# Altium footprint library ICs And Semiconductors THD.PcbLib: 292 footprints (part 13 of 19)
Each footprint in its own frame and in the unit in brackets; x right, y up, seen from the top. Pads: shape width x height; smd on the part's side, far side on the other; paste and mask are expansions set on the pad; w line width, h text height; cw(c..) or ccw(c..) is an arc to the next point about the centre after c.
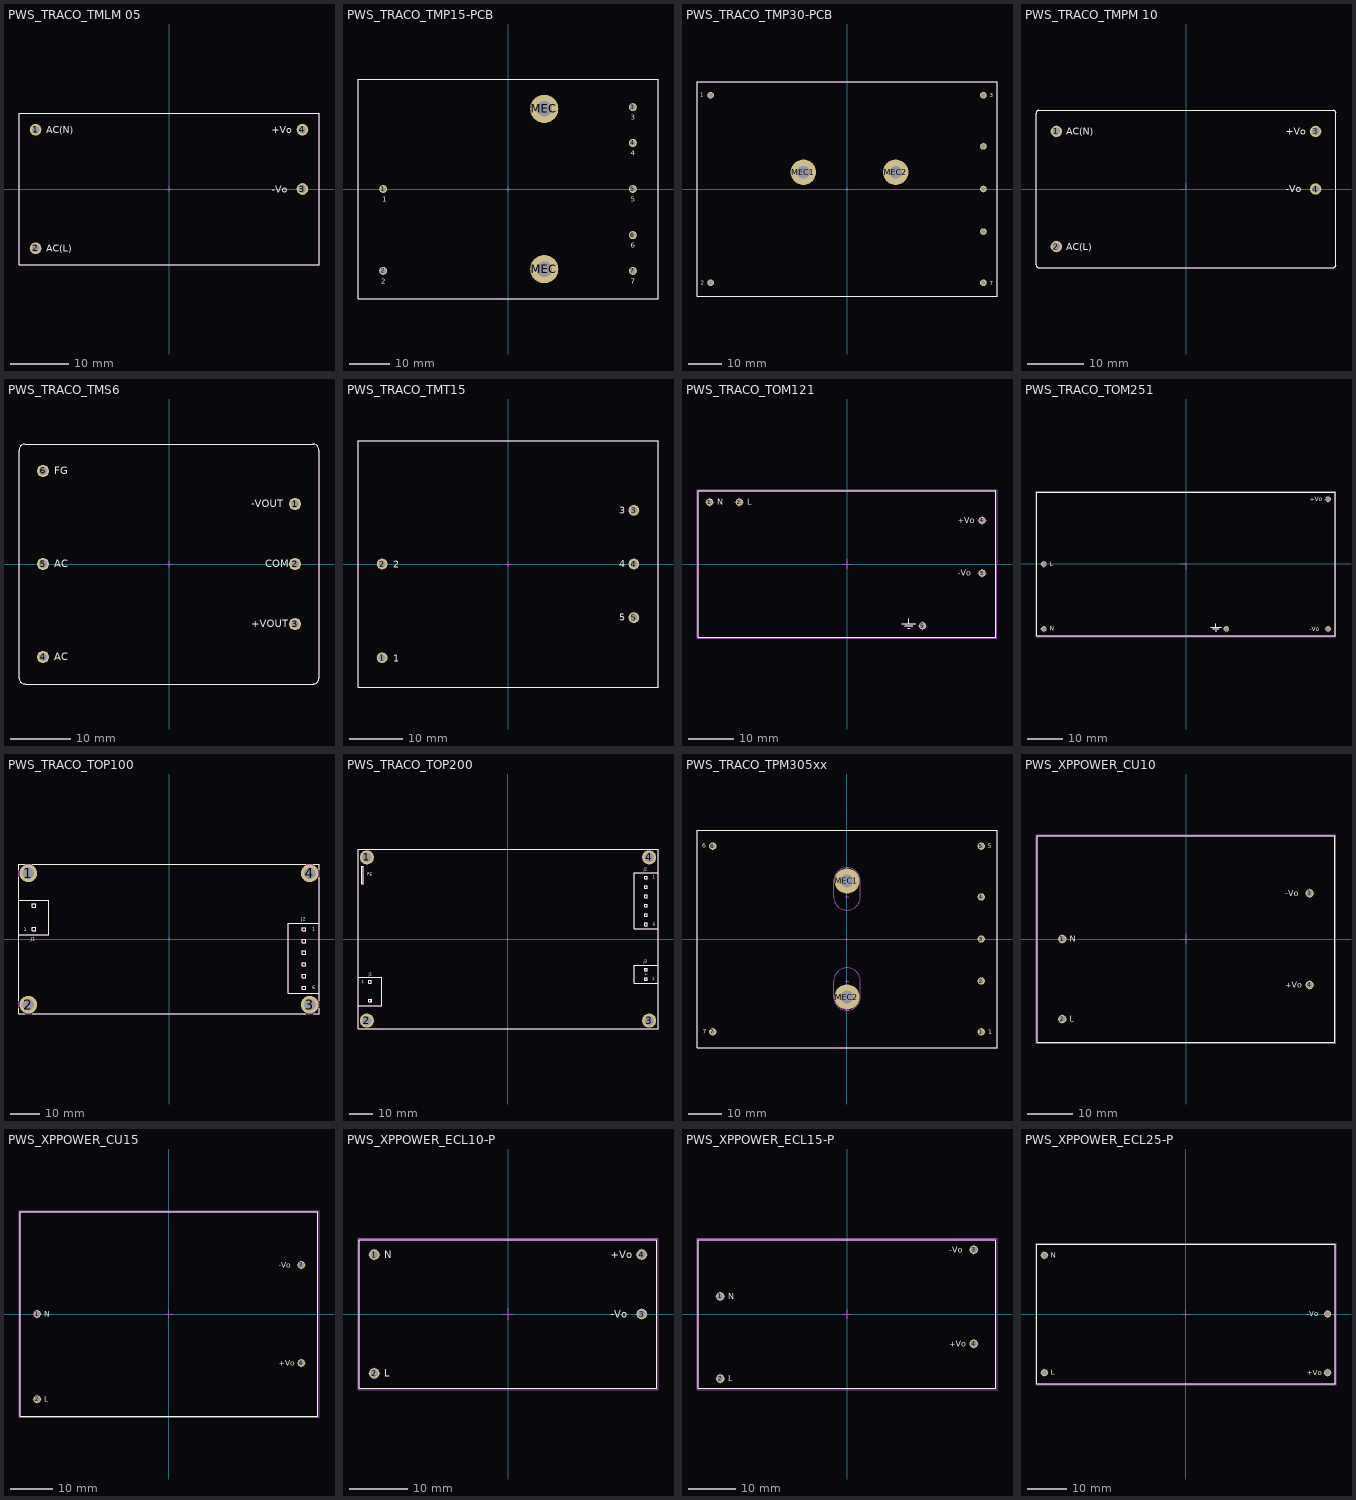
[diagram p12: the footprints below, top view; thin cyan lines are the x and y axes]

## PWS_TRACO_TMLM 05 [mm] "TMLM 05 Series , Body 50.9x25.5mm, Power Supply"
height 15.66
pads (4):
  round 2 hole 1.3: 1(-22.86,10.16) 2(-22.86,-10.16) 3(22.86,0) 4(22.86,10.16)
Top Overlay:
  lines w0.2: -25.7,-13 -25.7,13 25.7,13 25.7,-13 -25.7,-13
  text "AC(L)" at -21.073,-10.793 h1.2
  text "-Vo" at 17.585,-0.61 h1.2
  text "+Vo" at 17.585,9.55 h1.2
  text "AC(N)" at -21.073,9.527 h1.2
Notvisible:
  lines w0.1: -23.36,-10.16 -22.86,-10.16 ; -23.36,10.16 -22.86,10.16 ; -22.86,-10.66 -22.86,-10.16 ; -22.86,-9.66 -22.86,-10.16 ; -22.86,9.66 -22.86,10.16 ; -22.86,10.66 -22.86,10.16 ; -22.36,-10.16 -22.86,-10.16 ; -22.36,10.16 -22.86,10.16 ; -0.5,0 0,0 ; 0,-0.5 0,0 ; 0,0.5 0,0 ; 0.5,0 0,0 ; 22.36,0 22.86,0 ; 22.36,10.16 22.86,10.16 ; 22.86,-0.5 22.86,0 ; 22.86,0.5 22.86,0 ; 22.86,9.66 22.86,10.16 ; 22.86,10.66 22.86,10.16 ; 23.36,0 22.86,0 ; 23.36,10.16 22.86,10.16
Mechanical 14:
  lines w0.1: -25.7,-13 -25.7,13 25.7,13 25.7,-13 -25.7,-13
  text "AC(L)" at -21.073,-10.793 h1.2
  text "AC(N)" at -21.073,9.527 h1.2
  text "+Vo" at 17.585,9.55 h1.2
  text "-Vo" at 17.585,-0.61 h1.2
3D body "PWS_TRACO_TMLM 05.stp": height 15.75, standoff -3.8, extent -25.7,-13 25.7,13

## PWS_TRACO_TMP15-PCB [mm] "TMP15 Model For PCB Mount, Body 74x54mm"
height 19.8
pads (9):
  round 2 hole 1.3: 1(-31,0) 2(-31,-20.32) 3(31,20.32) 4(31,11.43) 5(31,0) 6(31,-11.43) 7(31,-20.32)
  round 7 hole 3.8: MEC(9,-19.9) MEC(9,19.9)
Top Overlay:
  lines w0.2: -37.25,-27.25 37.25,-27.25 37.25,27.25 -37.25,27.25 -37.25,-27.25
  text "3" at 30.53,17.16 h1.27
  text "1" at -31.27,-3.16 h1.27
  text "2" at -31.47,-23.48 h1.27
  text "6" at 30.53,-14.59 h1.27
  text "7" at 30.53,-23.48 h1.27
  text "5" at 30.53,-3.16 h1.27
  text "4" at 30.53,8.27 h1.27
Notvisible:
  lines w0.1: -31.5,-20.32 -31,-20.32 ; -31.5,0 -31,0 ; -31,-20.82 -31,-20.32 ; -31,-19.82 -31,-20.32 ; -31,-0.5 -31,0 ; -31,0.5 -31,0 ; -30.5,-20.32 -31,-20.32 ; -30.5,0 -31,0 ; -0.5,0 0,0 ; 0,-0.5 0,0 ; 0,0.5 0,0 ; 0.5,0 0,0 ; 8.5,-19.9 9,-19.9 ; 8.5,19.9 9,19.9 ; 9,-20.4 9,-19.9 ; 9,-19.4 9,-19.9 ; 9,19.4 9,19.9 ; 9,20.4 9,19.9 ; 9.5,-19.9 9,-19.9 ; 9.5,19.9 9,19.9 ; 30.5,-20.32 31,-20.32 ; 30.5,-11.43 31,-11.43 ; 30.5,0 31,0 ; 30.5,11.43 31,11.43 ; 30.5,20.32 31,20.32 ; 31,-20.82 31,-20.32 ; 31,-19.82 31,-20.32 ; 31,-11.93 31,-11.43 ; 31,-10.93 31,-11.43 ; 31,-0.5 31,0 ; 31,0.5 31,0 ; 31,10.93 31,11.43 ; 31,11.93 31,11.43 ; 31,19.82 31,20.32 ; 31,20.82 31,20.32 ; 31.5,-20.32 31,-20.32 ; 31.5,-11.43 31,-11.43 ; 31.5,0 31,0 ; 31.5,11.43 31,11.43 ; 31.5,20.32 31,20.32
Mechanical 14:
  lines w0.1: -37.25,-27.25 37.25,-27.25 37.25,27.25 -37.25,27.25 -37.25,-27.25
  text "3" at 30.53,17.16 h1.27
  text "1" at -31.27,-3.16 h1.27
  text "2" at -31.47,-23.48 h1.27
  text "6" at 30.53,-14.59 h1.27
  text "7" at 30.53,-23.48 h1.27
  text "5" at 30.53,-3.16 h1.27
  text "4" at 30.53,8.27 h1.27
3D body "PWS_TRACO_TMP15-PCB.stp": height 19.85, standoff -4.3, extent -37.25,-27.25 37.25,27.25

## PWS_TRACO_TMP30-PCB [mm] "TPM  30W Model For PCB Mount, Body 88.9x63.5mm"
height 22
pads (9):
  round 2 hole 1.3: 1(-40.65,27.94) 2(-40.65,-27.94) 3(40.65,27.94) 4(40.65,12.7) 5(40.65,0) 6(40.65,-12.7) 7(40.65,-27.94)
  round 7.6 hole 3.8: MEC1(-13,5) MEC2(14.5,5)
Top Overlay:
  lines w0.2: -44.7,-32 -44.7,32 44.7,32 44.7,-32 -44.7,-32
  text "7" at 42.58,-28.71 h1.2
  text "1" at -43.72,27.46 h1.2
  text "2" at -43.52,-28.605 h1.2
  text "3" at 42.48,27.365 h1.2
Notvisible:
  lines w0.1: -41.15,-27.94 -40.65,-27.94 ; -41.15,27.94 -40.65,27.94 ; -40.65,-28.44 -40.65,-27.94 ; -40.65,-27.44 -40.65,-27.94 ; -40.65,27.44 -40.65,27.94 ; -40.65,28.44 -40.65,27.94 ; -40.15,-27.94 -40.65,-27.94 ; -40.15,27.94 -40.65,27.94 ; -13.5,5 -13,5 ; -13,4.5 -13,5 ; -13,5.5 -13,5 ; -12.5,5 -13,5 ; -0.5,0 0,0 ; 0,-0.5 0,0 ; 0,0.5 0,0 ; 0.5,0 0,0 ; 14,5 14.5,5 ; 14.5,4.5 14.5,5 ; 14.5,5.5 14.5,5 ; 15,5 14.5,5 ; 40.15,-27.94 40.65,-27.94 ; 40.15,-12.7 40.65,-12.7 ; 40.15,0 40.65,0 ; 40.15,12.7 40.65,12.7 ; 40.15,27.94 40.65,27.94 ; 40.65,-28.44 40.65,-27.94 ; 40.65,-27.44 40.65,-27.94 ; 40.65,-13.2 40.65,-12.7 ; 40.65,-12.2 40.65,-12.7 ; 40.65,-0.5 40.65,0 ; 40.65,0.5 40.65,0 ; 40.65,12.2 40.65,12.7 ; 40.65,13.2 40.65,12.7 ; 40.65,27.44 40.65,27.94 ; 40.65,28.44 40.65,27.94 ; 41.15,-27.94 40.65,-27.94 ; 41.15,-12.7 40.65,-12.7 ; 41.15,0 40.65,0 ; 41.15,12.7 40.65,12.7 ; 41.15,27.94 40.65,27.94
Mechanical 14:
  lines w0.1: -44.7,-32 -44.7,32 44.7,32 44.7,-32 -44.7,-32
  text "7" at 42.58,-28.71 h1.2
  text "1" at -43.72,27.46 h1.2
  text "2" at -43.52,-28.605 h1.2
  text "3" at 42.48,27.365 h1.2
3D body "PWS_TRACO_TMP30-PCB.stp": height 22, standoff -3.6, extent -44.7,-32 44.7,32

## PWS_TRACO_TMPM 10 [mm] "TMPM 10 Series, Body 52.4x27.2mm, Power Supply"
height 24
pads (4):
  round 2 hole 1.3: 1(-22.86,10.16) 2(-22.86,-10.16) 3(22.86,10.16) 4(22.86,0)
Top Overlay:
  lines w0.2: -26.45,-13.35 ccw(c-25.95,-13.35) -25.95,-13.85 25.95,-13.85 ccw(c25.95,-13.35) 26.45,-13.35 26.45,13.35 ccw(c25.95,13.35) 25.95,13.85 -25.95,13.85 ccw(c-25.95,13.35) -26.45,13.35 -26.45,-13.35
  text "AC(N)" at -21.073,9.527 h1.2
  text "+Vo" at 17.585,9.55 h1.2
  text "-Vo" at 17.585,-0.61 h1.2
  text "AC(L)" at -21.073,-10.793 h1.2
Notvisible:
  lines w0.2: -23.86,-10.16 -22.86,-10.16 -22.86,-9.16 ; -23.86,10.16 -22.86,10.16 -22.86,11.16 ; -1,0 0,0 0,1 ; 21.86,0 22.86,0 22.86,1 ; 21.86,10.16 22.86,10.16 22.86,11.16
  text "3" at 24.765,9.525 h1.2
  text "4" at 24.765,-0.635 h1.2
  text "2" at -25.4,-10.795 h1.2
  text "1" at -25.4,9.527 h1.2
Mechanical 14:
  lines w0.1: -26.45,-13.35 ccw(c-25.95,-13.35) -25.95,-13.85 25.95,-13.85 ccw(c25.95,-13.35) 26.45,-13.35 26.45,13.35 ccw(c25.95,13.35) 25.95,13.85 -25.95,13.85 ccw(c-25.95,13.35) -26.45,13.35 -26.45,-13.35
  text "-Vo" at 17.585,-0.61 h1.2
  text "+Vo" at 17.585,9.55 h1.2
  text "AC(N)" at -21.073,9.527 h1.2
  text "AC(L)" at -21.073,-10.793 h1.2
3D body "PWS_TRACO_TMPM 10.stp": height 24, standoff -3.1, extent -26.45,-13.85 26.45,13.85

## PWS_TRACO_TMS6 [mm] "TMS 6 Series , Body 50x40mm, Height 20mm"
height 20
pads (6):
  round 2 hole 1.3: 1(21,10) 2(21,0) 3(21,-10) 4(-21,-15.5) 5(-21,0) 6(-21,15.5)
Top Overlay:
  lines w0.2: -25,-19 ccw(c-24,-19) -24,-20 24,-20 ccw(c24,-19) 25,-19 25,19 ccw(c24,19) 24,20 -24,20 ccw(c-24,19) -25,19 -25,-19
  text "-VOUT" at 13.719,9.495 h1.2
  text "COM" at 16.025,-0.55 h1.2
  text "+VOUT" at 13.719,-10.505 h1.2
  text "FG" at -19.125,14.95 h1.2
  text "AC" at -19.125,-0.55 h1.2
  text "AC" at -19.125,-16.05 h1.2
Notvisible:
  lines w0.1: -21.5,-15.5 -21,-15.5 ; -21.5,0 -21,0 ; -21.5,15.5 -21,15.5 ; -21,-16 -21,-15.5 ; -21,-15 -21,-15.5 ; -21,-0.5 -21,0 ; -21,0.5 -21,0 ; -21,15 -21,15.5 ; -21,16 -21,15.5 ; -20.5,-15.5 -21,-15.5 ; -20.5,0 -21,0 ; -20.5,15.5 -21,15.5 ; -0.5,0 0,0 ; 0,-0.5 0,0 ; 0,0.5 0,0 ; 0.5,0 0,0 ; 20.5,-10 21,-10 ; 20.5,0 21,0 ; 20.5,10 21,10 ; 21,-10.5 21,-10 ; 21,-9.5 21,-10 ; 21,-0.5 21,0 ; 21,0.5 21,0 ; 21,9.5 21,10 ; 21,10.5 21,10 ; 21.5,-10 21,-10 ; 21.5,0 21,0 ; 21.5,10 21,10
Mechanical 14:
  lines w0.1: -25,-19 ccw(c-24,-19) -24,-20 24,-20 ccw(c24,-19) 25,-19 25,19 ccw(c24,19) 24,20 -24,20 ccw(c-24,19) -25,19 -25,-19
  text "AC" at -19.125,-16.05 h1.2
  text "AC" at -19.125,-0.55 h1.2
  text "FG" at -19.125,14.95 h1.2
  text "+VOUT" at 13.719,-10.505 h1.2
  text "COM" at 16.025,-0.55 h1.2
  text "-VOUT" at 13.719,9.495 h1.2
3D body "PWS_TRACO_TMS6.stp": height 20.1, standoff -3.6, extent -25,-20 25,20

## PWS_TRACO_TMT15 [mm] "TMT  15W Model For PCB Mount, Body 55x45mm"
height 25
pads (5):
  round 2 hole 1.3: 1(-23.5,-17.5) 2(-23.5,0) 3(23.5,10) 4(23.5,0) 5(23.5,-10)
Top Overlay:
  lines w0.2: -28,-23 28,-23 28,23 -28,23 -28,-23
  text "3" at 20.72,9.41 h1.27
  text "4" at 20.72,-0.59 h1.27
  text "5" at 20.72,-10.59 h1.27
  text "2" at -21.42,-0.71 h1.27
  text "1" at -21.42,-18.21 h1.27
Notvisible:
  lines w0.1: -24,-17.5 -23.5,-17.5 ; -24,0 -23.5,0 ; -23.5,-18 -23.5,-17.5 ; -23.5,-17 -23.5,-17.5 ; -23.5,-0.5 -23.5,0 ; -23.5,0.5 -23.5,0 ; -23,-17.5 -23.5,-17.5 ; -23,0 -23.5,0 ; -0.5,0 0,0 ; 0,-0.5 0,0 ; 0,0.5 0,0 ; 0.5,0 0,0 ; 23,-10 23.5,-10 ; 23,0 23.5,0 ; 23,10 23.5,10 ; 23.5,-10.5 23.5,-10 ; 23.5,-9.5 23.5,-10 ; 23.5,-0.5 23.5,0 ; 23.5,0.5 23.5,0 ; 23.5,9.5 23.5,10 ; 23.5,10.5 23.5,10 ; 24,-10 23.5,-10 ; 24,0 23.5,0 ; 24,10 23.5,10
Mechanical 14:
  lines w0.1: -28,-23 -28,23 28,23 28,-23 -28,-23
  text "3" at 20.72,9.41 h1.27
  text "4" at 20.72,-0.59 h1.27
  text "5" at 20.72,-10.59 h1.27
  text "2" at -21.42,-0.71 h1.27
  text "1" at -21.42,-18.21 h1.27
3D body "PWS_TRACO_TMT15.stp": height 25, standoff -3.8, extent -28,-23 28,23

## PWS_TRACO_TOM121 [mm] "TOM12W Single Output Series , Body 65x32mm, Power Supply"
height 23
pads (5):
  round 1.6 hole 1.1: 1(-30,13.5) 2(-23.5,13.5) 3(29.5,-2) 4(29.5,9.5) 5(16.5,-13.5)
Top Overlay:
  lines w0.2: 12,-13 15,-13 ; 12.6,-13.5 14.4,-13.5 ; 13.3,-14 13.7,-14 ; 13.5,-13 13.5,-12 ; -32.5,-16 -32.5,16 32.5,16 32.5,-16 -32.5,-16
  text "-Vo" at 24.225,-2.61 h1.27
  text "+Vo" at 24.225,8.89 h1.27
  text "L" at -21.825,12.91 h1.27
  text "N" at -28.325,12.91 h1.27
Notvisible:
  lines w0.1: -31,13.5 -30,13.5 ; -30,12.5 -30,13.5 ; -30,14.5 -30,13.5 ; -29,13.5 -30,13.5 ; -24.5,13.5 -23.5,13.5 ; -23.5,12.5 -23.5,13.5 ; -23.5,14.5 -23.5,13.5 ; -22.5,13.5 -23.5,13.5 ; -1,0 0,0 ; 0,-1 0,0 ; 0,1 0,0 ; 1,0 0,0 ; 15.5,-13.5 16.5,-13.5 ; 16.5,-14.5 16.5,-13.5 ; 16.5,-12.5 16.5,-13.5 ; 17.5,-13.5 16.5,-13.5 ; 28.5,-2 29.5,-2 ; 28.5,9.5 29.5,9.5 ; 29.5,-3 29.5,-2 ; 29.5,-1 29.5,-2 ; 29.5,8.5 29.5,9.5 ; 29.5,10.5 29.5,9.5 ; 30.5,-2 29.5,-2 ; 30.5,9.5 29.5,9.5
Mechanical 14:
  lines w0.1: 12,-13 15,-13 ; 12.6,-13.5 14.4,-13.5 ; 13.3,-14 13.7,-14 ; 13.5,-13 13.5,-12 ; -32.5,-16 -32.5,16 32.5,16 32.5,-16 -32.5,-16
  text "-Vo" at 24.225,-2.61 h1.27
  text "+Vo" at 24.225,8.89 h1.27
  text "L" at -21.825,12.91 h1.27
  text "N" at -28.325,12.91 h1.27
Mechanical 15:
  lines w0.05: -32.75,-16.25 -32.75,16.25 32.75,16.25 32.75,-16.25 -32.75,-16.25
3D body: height 23, standoff 4.4, extent -32.5,-16 32.5,16
3D body: height 4.4, standoff -3, extent -23.9,13.101 -23.101,13.899
3D body: height 4.4, standoff -3, extent -30.4,13.101 -29.601,13.899
3D body: height 4.4, standoff -3, extent 16.101,-13.899 16.899,-13.101
3D body: height 4.4, standoff -3, extent 29.101,-2.399 29.9,-1.601
3D body: height 4.4, standoff -3, extent 29.101,9.101 29.9,9.899

## PWS_TRACO_TOM251 [mm] "TOM25W Single Output Series , Body 85x41mm, Power Supply"
height 29.5
pads (5):
  round 1.6 hole 1.1: 1(-40.5,-18.5) 2(-40.5,0) 3(40.5,-18.5) 4(40.5,18.5) 5(11.5,-18.5)
Top Overlay:
  lines w0.2: 7,-18 10,-18 ; 7.6,-18.5 9.4,-18.5 ; 8.3,-19 8.7,-19 ; 8.5,-18 8.5,-17 ; -42.5,-20.5 -42.5,20.5 42.5,20.5 42.5,-20.5 -42.5,-20.5
  text "-Vo" at 35.225,-19.11 h1.27
  text "+Vo" at 35.225,17.89 h1.27
  text "L" at -38.825,-0.59 h1.27
  text "N" at -38.825,-19.09 h1.27
Notvisible:
  lines w0.1: -41.5,-18.5 -40.5,-18.5 -40.5,-19.5 ; -41.5,0 -40.5,0 -40.5,-1 ; -1.5,0 0,0 0,-1.5 ; 10.5,-18.5 11.5,-18.5 11.5,-19.5 ; 39.5,-18.5 40.5,-18.5 40.5,-19.5 ; 39.5,18.5 40.5,18.5 40.5,17.5
Mechanical 14:
  lines w0.1: 7,-18 10,-18 ; 7.6,-18.5 9.4,-18.5 ; 8.3,-19 8.7,-19 ; 8.5,-18 8.5,-17 ; -42.5,-20.5 42.5,-20.5 42.5,20.5 -42.5,20.5 -42.5,-20.5
  text "N" at -38.825,-19.09 h1.27
  text "L" at -38.825,-0.59 h1.27
  text "+Vo" at 35.225,17.89 h1.27
  text "-Vo" at 35.225,-19.11 h1.27
Mechanical 15:
  lines w0.05: -42.75,-20.75 -42.75,20.75 42.75,20.75 42.75,-20.75 -42.75,-20.75
3D body: height 4.4, standoff -3, extent 40.101,18.101 40.899,18.899
3D body: height 4.4, standoff -3, extent 40.101,-18.899 40.899,-18.101
3D body: height 4.4, standoff -3, extent 11.101,-18.899 11.899,-18.101
3D body: height 4.4, standoff -3, extent -40.899,-18.899 -40.101,-18.101
3D body: height 4.4, standoff -3, extent -40.899,-0.399 -40.101,0.399
3D body: height 29.5, standoff 4.4, extent -42.5,-20.5 42.5,20.5

## PWS_TRACO_TOP100 [mm] "TOP 100 Serie 100W Power Supplies, Body 101.6 x 50.8mm"
height 33.2
pads (4):
  round 6 hole 4: 1(-47.65,22.25) 2(-47.65,-22.25) 3(47.65,-22.25) 4(47.65,22.25)
Top Overlay:
  lines w0.2: -50.8,-23.53 -50.8,-25.4 -48.93,-25.4 ; -50.8,-20.97 -50.8,20.97 ; -50.8,1.465 -40.792,1.465 -40.792,13.2 -50.8,13.2 ; -50.8,23.53 -50.8,25.4 -48.93,25.4 ; -46.37,-25.4 46.37,-25.4 ; -46.37,25.4 46.37,25.4 ; 48.93,-25.4 50.8,-25.4 50.8,-23.53 ; 48.93,25.4 50.8,25.4 50.8,23.53 ; 50.8,-20.97 50.8,20.97 ; 50.8,-3.16 50.8,-18.4 40.4,-18.4 40.4,5.34 50.8,5.34 ; -46.266,2.799 -45.123,2.799 -45.123,3.942 -46.266,3.942 -46.266,2.799 ; -46.266,10.724 -45.123,10.724 -45.123,11.867 -46.266,11.867 -46.266,10.724 ; 45.123,-17.067 46.266,-17.067 46.266,-15.924 45.123,-15.924 45.123,-17.067 ; 45.123,-13.104 46.266,-13.104 46.266,-11.961 45.123,-11.961 45.123,-13.104 ; 45.123,-9.142 46.266,-9.142 46.266,-7.999 45.123,-7.999 45.123,-9.142 ; 45.123,-5.179 46.266,-5.179 46.266,-4.036 45.123,-4.036 45.123,-5.179 ; 45.123,-1.217 46.266,-1.217 46.266,-0.074 45.123,-0.074 45.123,-1.217 ; 45.123,2.746 46.266,2.746 46.266,3.889 45.123,3.889 45.123,2.746
  text "J1" at -46.825,-0.51 h1.2
  text "J2" at 44.775,6.19 h1.2
  text "1" at 48.525,2.79 h1.2
  text "6" at 48.525,-17.022 h1.2
  text "1" at -49.141,2.644 h1.2
Notvisible:
  lines w0.1: -48.15,-22.25 -47.65,-22.25 ; -48.15,22.25 -47.65,22.25 ; -47.65,-22.75 -47.65,-22.25 ; -47.65,-21.75 -47.65,-22.25 ; -47.65,21.75 -47.65,22.25 ; -47.65,22.75 -47.65,22.25 ; -47.15,-22.25 -47.65,-22.25 ; -47.15,22.25 -47.65,22.25 ; -0.5,0 0,0 ; 0,-0.5 0,0 ; 0,0.5 0,0 ; 0.5,0 0,0 ; 47.15,-22.25 47.65,-22.25 ; 47.15,22.25 47.65,22.25 ; 47.65,-22.75 47.65,-22.25 ; 47.65,-21.75 47.65,-22.25 ; 47.65,21.75 47.65,22.25 ; 47.65,22.75 47.65,22.25 ; 48.15,-22.25 47.65,-22.25 ; 48.15,22.25 47.65,22.25
Mechanical 14:
  circle w0.1: c-47.65,-22.25 r2
  circle w0.1: c-47.65,22.25 r2
  circle w0.1: c47.65,22.25 r2
  circle w0.1: c47.65,-22.25 r2
  lines w0.1: -50.8,1.465 -40.792,1.465 -40.792,13.2 -50.8,13.2 ; 50.8,-18.4 40.4,-18.4 40.4,5.34 50.8,5.34 ; -50.8,-25.4 50.8,-25.4 50.8,25.4 -50.8,25.4 -50.8,-25.4 ; -46.266,2.799 -45.123,2.799 -45.123,3.942 -46.266,3.942 -46.266,2.799 ; -46.266,10.724 -45.123,10.724 -45.123,11.867 -46.266,11.867 -46.266,10.724 ; 45.123,-17.067 46.266,-17.067 46.266,-15.924 45.123,-15.924 45.123,-17.067 ; 45.123,-13.104 46.266,-13.104 46.266,-11.961 45.123,-11.961 45.123,-13.104 ; 45.123,-9.142 46.266,-9.142 46.266,-7.999 45.123,-7.999 45.123,-9.142 ; 45.123,-5.179 46.266,-5.179 46.266,-4.036 45.123,-4.036 45.123,-5.179 ; 45.123,-1.217 46.266,-1.217 46.266,-0.074 45.123,-0.074 45.123,-1.217 ; 45.123,2.746 46.266,2.746 46.266,3.889 45.123,3.889 45.123,2.746
  text "J1" at -46.825,-0.51 h1.2
  text "J2" at 44.775,6.19 h1.2
  text "1" at 48.525,2.79 h1.2
  text "6" at 48.525,-17.022 h1.2
  text "1" at -49.141,2.644 h1.2
3D body "PWS_TRACO_TOP100.stp": height 34.8, standoff -5.4, extent -50.8,-25.425 50.8,25.426

## PWS_TRACO_TOP200 [mm] "TOP 200 Serie 200W Power Supplies, Body 127 x 76.2mm"
height 35.4
pads (4):
  round 6 hole 4: 1(-59.75,34.55) 2(-59.75,-34.55) 3(59.75,-34.55) 4(59.75,34.55)
Top Overlay:
  lines w0.2: -63.5,-28.219 -53.492,-28.219 -53.492,-16.205 -63.5,-16.205 ; 56.236,4.293 63.5,4.318 53.492,4.318 53.492,27.975 63.5,27.975 ; 59.436,-18.8 57.214,-18.8 63.5,-18.8 ; 59.436,-11.028 57.214,-11.028 63.5,-11.028 ; 61.576,-18.8 63.5,-18.8 ; 61.576,-11.028 63.5,-11.028 ; -58.966,-26.607 -57.823,-26.607 -57.823,-25.464 -58.966,-25.464 ; -58.966,-26.607 -58.966,-25.464 ; -58.966,-26.607 -58.966,-25.464 ; -58.966,-26.607 -57.747,-26.607 -57.747,-25.464 -58.966,-25.464 ; -58.966,-18.682 -57.823,-18.682 ; -58.966,-18.682 -58.966,-17.539 ; -58.966,-18.682 -58.966,-17.539 ; -58.966,-18.682 -57.823,-18.682 ; -58.966,-17.539 -57.823,-17.539 ; -58.966,-17.539 -57.823,-17.539 ; -57.823,-18.682 -57.823,-17.539 ; -57.823,-18.682 -57.823,-17.539 ; 63.5,-18.8 53.492,-18.8 53.492,-11.028 63.5,-11.028 ; -63.5,-38.1 -63.5,38.1 63.5,38.1 63.5,-38.1 -63.5,-38.1 ; -62,23.307 -61.2,23.307 -61.2,30.8 -62,30.8 -62,23.307 ; 57.823,-17.467 58.966,-17.467 58.966,-16.324 57.823,-16.324 57.823,-17.467 ; 57.823,-13.504 58.966,-13.504 58.966,-12.361 57.823,-12.361 57.823,-13.504 ; 57.823,5.652 58.966,5.652 58.966,6.795 57.823,6.795 57.823,5.652 ; 57.823,9.614 58.966,9.614 58.966,10.757 57.823,10.757 57.823,9.614 ; 57.823,13.576 58.966,13.576 58.966,14.719 57.823,14.719 57.823,13.576 ; 57.823,17.539 58.966,17.539 58.966,18.682 57.823,18.682 57.823,17.539 ; 57.823,21.501 58.966,21.501 58.966,22.644 57.823,22.644 57.823,21.501 ; 57.823,25.464 58.966,25.464 58.966,26.607 57.823,26.607 57.823,25.464
  text "1" at 61.025,-17.554 h1.2
  text "J3" at 57.541,-10.109 h1.2
  text "PE" at -59.659,26.691 h1.2
  text "1" at -61.841,-18.836 h1.2
  text "J1" at -58.925,-15.515 h1.2
  text "6" at 61.225,5.696 h1.2
  text "1" at 61.225,25.508 h1.2
  text "J2" at 57.475,28.908 h1.2
Notvisible:
  lines w0.1: -60.25,-34.55 -59.75,-34.55 ; -60.25,34.55 -59.75,34.55 ; -59.75,-35.05 -59.75,-34.55 ; -59.75,-34.05 -59.75,-34.55 ; -59.75,34.05 -59.75,34.55 ; -59.75,35.05 -59.75,34.55 ; -59.25,-34.55 -59.75,-34.55 ; -59.25,34.55 -59.75,34.55 ; -0.5,0 0,0 ; 0,-0.5 0,0 ; 0,0.5 0,0 ; 0.5,0 0,0 ; 57.895,-16.895 58.395,-16.895 ; 57.895,-14.914 58.395,-14.914 ; 57.895,-12.933 58.395,-12.933 ; 58.395,-17.395 58.395,-16.895 ; 58.395,-16.395 58.395,-16.895 ; 58.395,-15.414 58.395,-14.914 ; 58.395,-14.414 58.395,-14.914 ; 58.395,-13.433 58.395,-12.933 ; 58.395,-12.433 58.395,-12.933 ; 58.895,-16.895 58.395,-16.895 ; 58.895,-14.914 58.395,-14.914 ; 58.895,-12.933 58.395,-12.933 ; 59.25,-34.55 59.75,-34.55 ; 59.25,34.55 59.75,34.55 ; 59.75,-35.05 59.75,-34.55 ; 59.75,-34.05 59.75,-34.55 ; 59.75,34.05 59.75,34.55 ; 59.75,35.05 59.75,34.55 ; 60.25,-34.55 59.75,-34.55 ; 60.25,34.55 59.75,34.55
Mechanical 14:
  circle w0.1: c-59.75,34.55 r2
  circle w0.1: c-59.75,-34.55 r2
  circle w0.1: c59.75,-34.55 r2
  circle w0.1: c59.75,34.55 r2
  lines w0.1: -63.5,-28.219 -53.492,-28.219 -53.492,-16.205 -63.5,-16.205 ; 56.236,4.293 63.5,4.318 53.492,4.318 53.492,27.975 63.5,27.975 ; 59.436,-18.8 57.214,-18.8 63.5,-18.8 ; 59.436,-11.028 57.214,-11.028 63.5,-11.028 ; 61.576,-18.8 63.5,-18.8 ; 61.576,-11.028 63.5,-11.028 ; -58.966,-26.607 -57.823,-26.607 -57.823,-25.464 -58.966,-25.464 ; -58.966,-26.607 -58.966,-25.464 ; -58.966,-26.607 -58.966,-25.464 ; -58.966,-26.607 -57.747,-26.607 -57.747,-25.464 -58.966,-25.464 ; -58.966,-18.682 -57.823,-18.682 ; -58.966,-18.682 -58.966,-17.539 ; -58.966,-18.682 -58.966,-17.539 ; -58.966,-18.682 -57.823,-18.682 ; -58.966,-17.539 -57.823,-17.539 ; -58.966,-17.539 -57.823,-17.539 ; -57.823,-18.682 -57.823,-17.539 ; -57.823,-18.682 -57.823,-17.539 ; 63.5,-18.8 63.5,-11.028 ; 63.5,-18.8 53.492,-18.8 53.492,-11.028 63.5,-11.028 ; -63.5,-38.1 -63.5,38.1 63.5,38.1 63.5,-38.1 -63.5,-38.1 ; -62,23.307 -61.2,23.307 -61.2,30.8 -62,30.8 -62,23.307 ; 57.823,-17.467 58.966,-17.467 58.966,-16.324 57.823,-16.324 57.823,-17.467 ; 57.823,-13.504 58.966,-13.504 58.966,-12.361 57.823,-12.361 57.823,-13.504 ; 57.823,5.652 58.966,5.652 58.966,6.795 57.823,6.795 57.823,5.652 ; 57.823,9.614 58.966,9.614 58.966,10.757 57.823,10.757 57.823,9.614 ; 57.823,13.576 58.966,13.576 58.966,14.719 57.823,14.719 57.823,13.576 ; 57.823,17.539 58.966,17.539 58.966,18.682 57.823,18.682 57.823,17.539 ; 57.823,21.501 58.966,21.501 58.966,22.644 57.823,22.644 57.823,21.501 ; 57.823,25.464 58.966,25.464 58.966,26.607 57.823,26.607 57.823,25.464
  text "1" at 61.025,-17.554 h1.2
  text "J3" at 57.541,-10.109 h1.2
  text "PE" at -59.659,26.691 h1.2
  text "1" at -61.841,-18.836 h1.2
  text "J1" at -58.925,-15.515 h1.2
  text "6" at 61.225,5.696 h1.2
  text "1" at 61.225,25.508 h1.2
  text "J2" at 57.475,28.908 h1.2
3D body "PWS_TRACO_TOP200.stp": height 35.4, standoff -5.4, extent -63.5,-38.1 63.5,38.1

## PWS_TRACO_TPM305xx [mm] "TPM  30/40W Model For PCB Mount, Body 90x65mm"
height 33.5
pads (9):
  round 2.2 hole 1.5: 1(40.5,-28) 2(40.5,-12.7) 3(40.5,0) 4(40.5,12.7) 5(40.5,28) 6(-40.5,28) 7(-40.5,-28)
  round 7.6 hole 3.8: MEC1(0,17.5) MEC2(0,-17.5)
Top Overlay:
  lines w0.2: -45.25,-32.75 -45.25,32.75 45.25,32.75 45.25,-32.75 -45.25,-32.75
  text "5" at 42.48,27.365 h1.27
  text "7" at -43.52,-28.605 h1.27
  text "6" at -43.72,27.46 h1.27
  text "1" at 42.58,-28.71 h1.27
Notvisible:
  lines w0.1: -41,-28 -40.5,-28 ; -41,28 -40.5,28 ; -40.5,-28.5 -40.5,-28 ; -40.5,-27.5 -40.5,-28 ; -40.5,27.5 -40.5,28 ; -40.5,28.5 -40.5,28 ; -40,-28 -40.5,-28 ; -40,28 -40.5,28 ; -0.5,-17.5 0,-17.5 ; -0.5,-12.7 0,-12.7 ; -0.5,0 0,0 ; -0.5,12.7 0,12.7 ; -0.5,17.5 0,17.5 ; 0,-18 0,-17.5 ; 0,-17 0,-17.5 ; 0,-13.2 0,-12.7 ; 0,-12.2 0,-12.7 ; 0,-0.5 0,0 ; 0,0.5 0,0 ; 0,12.2 0,12.7 ; 0,13.2 0,12.7 ; 0,17 0,17.5 ; 0,18 0,17.5 ; 0.5,-17.5 0,-17.5 ; 0.5,-12.7 0,-12.7 ; 0.5,0 0,0 ; 0.5,12.7 0,12.7 ; 0.5,17.5 0,17.5 ; 40,-28 40.5,-28 ; 40,-12.7 40.5,-12.7 ; 40,0 40.5,0 ; 40,12.7 40.5,12.7 ; 40,28 40.5,28 ; 40.5,-28.5 40.5,-28 ; 40.5,-27.5 40.5,-28 ; 40.5,-13.2 40.5,-12.7 ; 40.5,-12.2 40.5,-12.7 ; 40.5,-0.5 40.5,0 ; 40.5,0.5 40.5,0 ; 40.5,12.2 40.5,12.7 ; 40.5,13.2 40.5,12.7 ; 40.5,27.5 40.5,28 ; 40.5,28.5 40.5,28 ; 41,-28 40.5,-28 ; 41,-12.7 40.5,-12.7 ; 41,0 40.5,0 ; 41,12.7 40.5,12.7 ; 41,28 40.5,28 ; -4,-17.5 ccw(c0,-17.5) 4,-17.5 4,-12.7 ccw(c0,-12.7) -4,-12.7 -4,-17.5 ; -4,12.7 ccw(c0,12.7) 4,12.7 4,17.5 ccw(c0,17.5) -4,17.5 -4,12.7
Mechanical 14:
  lines w0.1: -45.25,-32.75 -45.25,32.75 45.25,32.75 45.25,-32.75 -45.25,-32.75
  text "5" at 42.48,27.365 h1.27
  text "7" at -43.52,-28.605 h1.27
  text "6" at -43.72,27.46 h1.27
  text "1" at 42.58,-28.71 h1.27
3D body "PWS_TRACO_TPM305xx.stp": height 33.5, standoff -3.6, extent -45.25,-32.75 45.25,32.75

## PWS_XPPOWER_CU10 [mm] "CU10 Series , Body 65.02x45mm, Power Supply"
height 23
pads (4):
  round 1.8 hole 1.3: 1(-27.01,0) 2(-27.01,-17.5) 3(26.99,9.98) 4(26.99,-10.03)
Top Overlay:
  lines w0.2: -32.51,-22.5 -32.51,22.5 32.51,22.5 32.51,-22.5 -32.51,-22.5
  text "+Vo" at 21.715,-10.64 h1.27
  text "L" at -25.335,-18.09 h1.27
  text "N" at -25.335,-0.59 h1.27
  text "-Vo" at 21.715,9.37 h1.27
Notvisible:
  lines w0.1: -28.01,-17.5 -27.01,-17.5 ; -28.01,0 -27.01,0 ; -27.01,-18.5 -27.01,-17.5 ; -27.01,-16.5 -27.01,-17.5 ; -27.01,-1 -27.01,0 ; -27.01,1 -27.01,0 ; -26.01,-17.5 -27.01,-17.5 ; -26.01,0 -27.01,0 ; -1,0 0,0 ; 0,-1 0,0 ; 0,1 0,0 ; 1,0 0,0 ; 25.99,-10.03 26.99,-10.03 ; 25.99,9.98 26.99,9.98 ; 26.99,-11.03 26.99,-10.03 ; 26.99,-9.03 26.99,-10.03 ; 26.99,8.98 26.99,9.98 ; 26.99,10.98 26.99,9.98 ; 27.99,-10.03 26.99,-10.03 ; 27.99,9.98 26.99,9.98
Mechanical 14:
  lines w0.1: -32.51,-22.5 -32.51,22.5 32.51,22.5 32.51,-22.5 -32.51,-22.5
  text "+Vo" at 21.715,-10.64 h1.27
  text "L" at -25.335,-18.09 h1.27
  text "N" at -25.335,-0.59 h1.27
  text "-Vo" at 21.715,9.37 h1.27
Mechanical 15:
  lines w0.05: -32.76,-22.75 -32.76,22.75 32.76,22.75 32.76,-22.75 -32.76,-22.75
3D body: height 4.4, standoff 0, extent -27.91,-18.4 -26.111,-16.601
3D body: height 0, standoff -3, extent -27.51,-18 -26.511,-17.001
3D body: height 4.4, standoff 0, extent -27.91,-0.899 -26.111,0.899
3D body: height 0, standoff -3, extent -27.51,-0.499 -26.511,0.499
3D body: height 4.4, standoff 0, extent 26.091,-10.93 27.89,-9.131
3D body: height 0, standoff -3, extent 26.491,-10.529 27.49,-9.531
3D body: height 4.4, standoff 0, extent 26.091,9.081 27.89,10.879
3D body: height 0, standoff -3, extent 26.491,9.481 27.49,10.479
3D body: height 23, standoff 4.4, extent -32.51,-22.5 32.51,22.5

## PWS_XPPOWER_CU15 [mm] "CU15 Series , Body 69.9x48mm, Power Supply"
height 23
pads (4):
  round 1.8 hole 1.3: 1(-30.95,0) 2(-30.95,-20) 3(31.05,11.51) 4(31.05,-11.5)
Top Overlay:
  lines w0.2: -34.95,-24 -34.95,24 34.95,24 34.95,-24 -34.95,-24
  text "-Vo" at 25.775,10.9 h1.27
  text "+Vo" at 25.775,-12.11 h1.27
  text "N" at -29.275,-0.59 h1.27
  text "L" at -29.275,-20.59 h1.27
Notvisible:
  lines w0.2: -31.95,-20 -30.95,-20 ; -31.95,0 -30.95,0 ; -30.95,-21 -30.95,-20 ; -30.95,-19 -30.95,-20 ; -30.95,-1 -30.95,0 ; -30.95,1 -30.95,0 ; -29.95,-20 -30.95,-20 ; -29.95,0 -30.95,0 ; -1,0 0,0 ; 0,-1 0,0 ; 0,1 0,0 ; 1,0 0,0 ; 30.05,-11.5 31.05,-11.5 ; 30.05,11.51 31.05,11.51 ; 31.05,-12.5 31.05,-11.5 ; 31.05,-10.5 31.05,-11.5 ; 31.05,10.51 31.05,11.51 ; 31.05,12.51 31.05,11.51 ; 32.05,-11.5 31.05,-11.5 ; 32.05,11.51 31.05,11.51
Mechanical 14:
  lines w0.1: -34.95,-24 -34.95,24 34.95,24 34.95,-24 -34.95,-24
  text "-Vo" at 25.775,10.9 h1.27
  text "+Vo" at 25.775,-12.11 h1.27
  text "N" at -29.275,-0.59 h1.27
  text "L" at -29.275,-20.59 h1.27
Mechanical 15:
  lines w0.05: -35.2,-24.25 -35.2,24.25 35.2,24.25 35.2,-24.25 -35.2,-24.25
3D body: height 23, standoff 4.4, extent -34.95,-24 34.95,24
3D body: height 0, standoff -3, extent 30.551,11.011 31.55,12.009
3D body: height 4.4, standoff 0, extent 30.151,10.611 31.95,12.41
3D body: height 0, standoff -3, extent 30.551,-11.999 31.55,-11.001
3D body: height 4.4, standoff 0, extent 30.151,-12.399 31.95,-10.601
3D body: height 0, standoff -3, extent -31.45,-20.5 -30.451,-19.501
3D body: height 4.4, standoff 0, extent -31.85,-20.9 -30.051,-19.101
3D body: height 0, standoff -3, extent -31.45,-0.499 -30.451,0.499
3D body: height 4.4, standoff 0, extent -31.85,-0.899 -30.051,0.899

## PWS_XPPOWER_ECL10-P [mm] "ECL10-P Series , Body 50.8x25.4mm, Power Supply"
height 22.86
pads (4):
  round 1.8 hole 1.3: 1(-22.86,10.16) 2(-22.86,-10.16) 3(22.86,0) 4(22.86,10.16)
Top Overlay:
  lines w0.2: -25.4,-12.7 25.4,-12.7 25.4,12.7 -25.4,12.7 -25.4,-12.7
  text "+Vo" at 17.585,9.55 h1.27
  text "-Vo" at 17.585,-0.61 h1.27
  text "N" at -21.185,9.57 h1.27
  text "L" at -21.185,-10.75 h1.27
Notvisible:
  lines w0.1: -23.86,-10.16 -22.86,-10.16 ; -23.86,10.16 -22.86,10.16 ; -22.86,-11.16 -22.86,-10.16 ; -22.86,-9.16 -22.86,-10.16 ; -22.86,9.16 -22.86,10.16 ; -22.86,11.16 -22.86,10.16 ; -21.86,-10.16 -22.86,-10.16 ; -21.86,10.16 -22.86,10.16 ; -1,0 0,0 ; 0,-1 0,0 ; 0,1 0,0 ; 1,0 0,0 ; 21.86,0 22.86,0 ; 21.86,10.16 22.86,10.16 ; 22.86,-1 22.86,0 ; 22.86,1 22.86,0 ; 22.86,9.16 22.86,10.16 ; 22.86,11.16 22.86,10.16 ; 23.86,0 22.86,0 ; 23.86,10.16 22.86,10.16
  lines w0.2: -23.86,-10.16 -22.86,-10.16 ; -23.86,10.16 -22.86,10.16 ; -22.86,-11.16 -22.86,-10.16 ; -22.86,-9.16 -22.86,-10.16 ; -22.86,9.16 -22.86,10.16 ; -22.86,11.16 -22.86,10.16 ; -21.86,-10.16 -22.86,-10.16 ; -21.86,10.16 -22.86,10.16 ; 21.86,0 22.86,0 ; 21.86,10.16 22.86,10.16 ; 22.86,-1 22.86,0 ; 22.86,1 22.86,0 ; 22.86,9.16 22.86,10.16 ; 22.86,11.16 22.86,10.16 ; 23.86,0 22.86,0 ; 23.86,10.16 22.86,10.16
Mechanical 14:
  lines w0.1: -25.4,-12.7 25.4,-12.7 25.4,12.7 -25.4,12.7 -25.4,-12.7
  text "+Vo" at 17.585,9.55 h1.27
  text "-Vo" at 17.585,-0.61 h1.27
  text "N" at -21.185,9.57 h1.27
  text "L" at -21.185,-10.75 h1.27
Mechanical 15:
  lines w0.05: -25.65,-12.95 -25.65,12.95 25.65,12.95 25.65,-12.95 -25.65,-12.95
3D body: height 22.86, standoff 4.4, extent -25.45,-12.75 25.45,12.75
3D body: height 4.4, standoff 0, extent 21.961,9.261 23.76,11.06
3D body: height 0, standoff -3, extent 22.361,9.661 23.36,10.659
3D body: height 4.4, standoff 0, extent 21.961,-0.899 23.76,0.899
3D body: height 0, standoff -3, extent 22.361,-0.499 23.36,0.499
3D body: height 4.4, standoff 0, extent -23.76,9.261 -21.961,11.06
3D body: height 0, standoff -3, extent -23.36,9.661 -22.361,10.659
3D body: height 4.4, standoff 0, extent -23.76,-11.059 -21.961,-9.261
3D body: height 0, standoff -3, extent -23.36,-10.659 -22.361,-9.661

## PWS_XPPOWER_ECL15-P [mm] "ECL15-P Series , Body 63.5x31.75mm, Power Supply"
height 25.4
pads (4):
  round 1.8 hole 1.3: 1(-27.05,3.755) 2(-27.05,-13.775) 3(27.05,13.715) 4(27.05,-6.355)
Top Overlay:
  lines w0.2: -31.75,-15.875 31.75,-15.875 31.75,15.875 -31.75,15.875 -31.75,-15.875
  text "+Vo" at 21.775,-6.965 h1.27
  text "-Vo" at 21.775,13.105 h1.27
  text "N" at -25.375,3.165 h1.27
  text "L" at -25.375,-14.365 h1.27
Notvisible:
  lines w0.1: -28.05,-13.775 -27.05,-13.775 ; -28.05,3.755 -27.05,3.755 ; -27.05,-14.775 -27.05,-13.775 ; -27.05,-12.775 -27.05,-13.775 ; -27.05,2.755 -27.05,3.755 ; -27.05,4.755 -27.05,3.755 ; -26.05,-13.775 -27.05,-13.775 ; -26.05,3.755 -27.05,3.755 ; -1,0 0,0 ; 0,-1 0,0 ; 0,1 0,0 ; 1,0 0,0 ; 26.05,-6.355 27.05,-6.355 ; 26.05,13.715 27.05,13.715 ; 27.05,-7.355 27.05,-6.355 ; 27.05,-5.355 27.05,-6.355 ; 27.05,12.715 27.05,13.715 ; 27.05,14.715 27.05,13.715 ; 28.05,-6.355 27.05,-6.355 ; 28.05,13.715 27.05,13.715
Mechanical 14:
  lines w0.1: -31.75,-15.875 31.75,-15.875 31.75,15.875 -31.75,15.875 -31.75,-15.875
  text "+Vo" at 21.775,-6.965 h1.27
  text "-Vo" at 21.775,13.105 h1.27
  text "N" at -25.375,3.165 h1.27
  text "L" at -25.375,-14.365 h1.27
Mechanical 15:
  lines w0.05: -32,-16.125 -32,16.125 32,16.125 32,-16.125 -32,-16.125
3D body: height 25.4, standoff 4.4, extent -31.75,-15.874 31.75,15.875
3D body: height 0, standoff -3, extent 26.551,13.216 27.55,14.214
3D body: height 4.4, standoff 0, extent 26.151,12.816 27.95,14.614
3D body: height 0, standoff -3, extent 26.551,-6.854 27.55,-5.856
3D body: height 4.4, standoff 0, extent 26.151,-7.254 27.95,-5.456
3D body: height 0, standoff -3, extent -27.55,-14.274 -26.551,-13.276
3D body: height 4.4, standoff 0, extent -27.95,-14.674 -26.151,-12.876
3D body: height 0, standoff -3, extent -27.55,3.256 -26.551,4.254
3D body: height 4.4, standoff 0, extent -27.95,2.856 -26.151,4.654

## PWS_XPPOWER_ECL25-P [mm] "ECL25-P Series , Body 76.2x35.6mm, Power Supply"
height 26.7
pads (4):
  round 1.8 hole 1.3: 1(-36.2,15) 2(-36.2,-15) 3(36.195,0) 4(36.2,-15)
Top Overlay:
  lines w0.2: -38.1,-17.8 -38.1,17.8 38.1,17.8 38.1,-17.8 -38.1,-17.8
  text "L" at -34.525,-15.59 h1.27
  text "N" at -34.525,14.41 h1.27
  text "-Vo" at 30.92,-0.61 h1.27
  text "+Vo" at 30.925,-15.61 h1.27
Notvisible:
  lines w0.1: -37.2,-15 -36.2,-15 ; -37.2,15 -36.2,15 ; -36.2,-16 -36.2,-15 ; -36.2,-14 -36.2,-15 ; -36.2,14 -36.2,15 ; -36.2,16 -36.2,15 ; -35.2,-15 -36.2,-15 ; -35.2,15 -36.2,15 ; -1,0 0,0 ; 0,-1 0,0 ; 0,1 0,0 ; 1,0 0,0 ; 35.195,0 36.195,0 ; 35.2,-15 36.2,-15 ; 36.195,-1 36.195,0 ; 36.195,1 36.195,0 ; 36.2,-16 36.2,-15 ; 36.2,-14 36.2,-15 ; 37.195,0 36.195,0 ; 37.2,-15 36.2,-15
Mechanical 14:
  lines w0.1: -38.1,-17.8 -38.1,17.8 38.1,17.8 38.1,-17.8 -38.1,-17.8
  text "L" at -34.525,-15.59 h1.27
  text "N" at -34.525,14.41 h1.27
  text "-Vo" at 30.92,-0.61 h1.27
  text "+Vo" at 30.925,-15.61 h1.27
Mechanical 15:
  lines w0.05: -38.35,-18.05 -38.35,18.05 38.35,18.05 38.35,-18.05 -38.35,-18.05
3D body: height 26.7, standoff 4.4, extent -38.2,-17.9 38.2,17.9
3D body: height 4.4, standoff 0, extent -37.1,14.101 -35.301,15.9
3D body: height 0, standoff -3, extent -36.7,14.501 -35.701,15.499
3D body: height 4.4, standoff 0, extent -37.1,-15.9 -35.301,-14.101
3D body: height 0, standoff -3, extent -36.7,-15.499 -35.701,-14.501
3D body: height 4.4, standoff 0, extent 35.301,-15.9 37.1,-14.101
3D body: height 0, standoff -3, extent 35.701,-15.499 36.7,-14.501
3D body: height 4.4, standoff 0, extent 35.301,-0.899 37.1,0.899
3D body: height 0, standoff -3, extent 35.701,-0.499 36.7,0.499